# Altium footprint library PCBLIB.PcbLib: 557 footprints (part 26 of 36)
Each footprint in its own frame and in the unit in brackets; x right, y up, seen from the top. Pads: shape width x height; smd on the part's side, far side on the other; paste and mask are expansions set on the pad; w line width, h text height; cw(c..) or ccw(c..) is an arc to the next point about the centre after c.
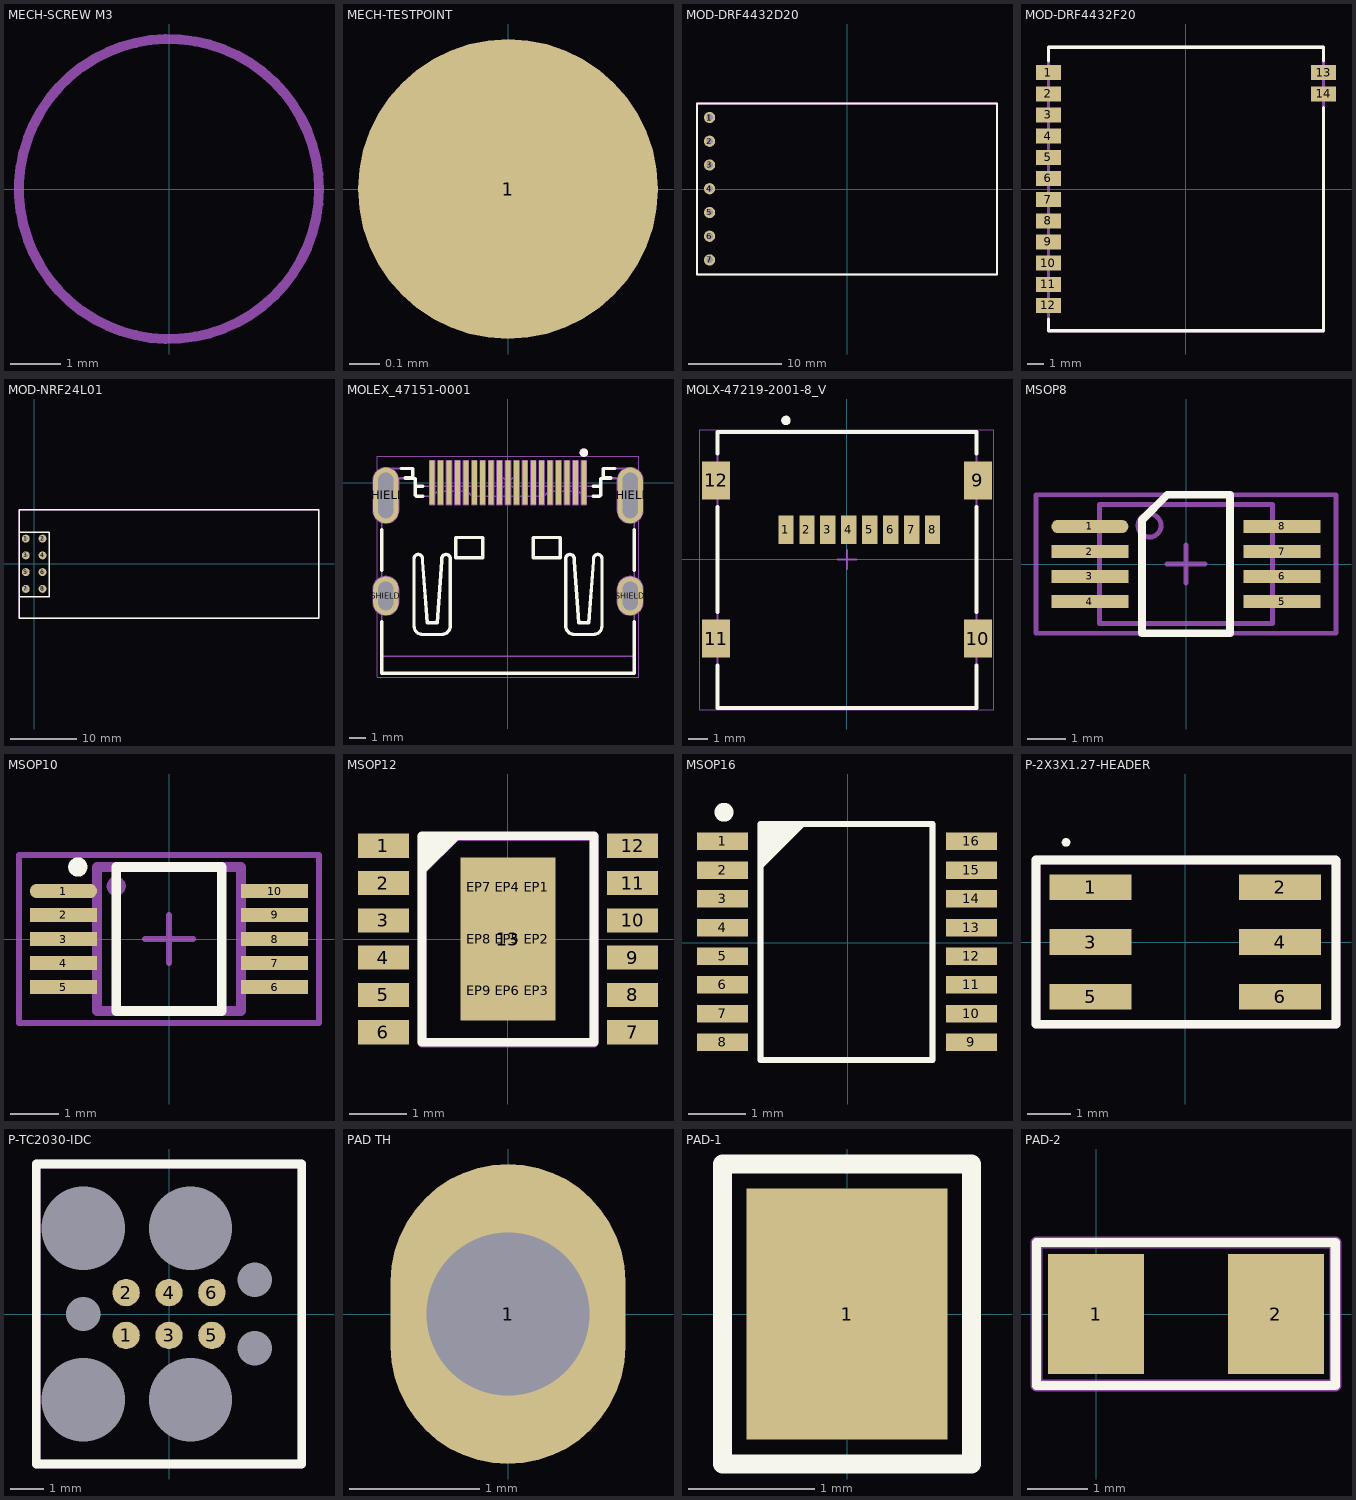
[diagram p25: the footprints below, top view; thin cyan lines are the x and y axes]

## MECH-SCREW M3 [mm] "YSB"
height 5
ASM Top:
  circle w0.2: c0,0 r3
  text ".designator" at -0.686,-0.229 h0.8
3D body "M3_YSB.STEP": height 2.37, standoff -4.99, extent -2.8,-2.8 2.803,2.8

## MECH-TESTPOINT [mm]
pads (1):
  round 1 smd paste-2 mask+0.1: 1(0,0)

## MOD-DRF4432D20 [mm]
pads (8):
  round 1.2 hole 0.7 mask+0.05: 1(-14.7,7.65) 1(-14.7,7.65) 2(-14.7,5.11) 3(-14.7,2.57) 4(-14.7,0.03) 5(-14.7,-2.51) 6(-14.7,-5.05) 7(-14.7,-7.59)
Top Overlay:
  lines w0.2: -16.05,-9.15 16.05,-9.15 16.05,9.15 -16.05,9.15 -16.05,-9.15
ASM Top:
  lines w0.2: -16.05,-9.15 16.05,-9.15 16.05,9.15 -16.05,9.15 -16.05,-9.15
  text ".designator" at -2.4,-0.3 h0.8
3D body: height 7, standoff 0, extent -16.05,-9.15 16.1,9.15

## MOD-DRF4432F20 [mm]
pads (14):
  rect 1.5x0.9 smd mask+0.05: 1(-8.25,6.985) 2(-8.25,5.715) 3(-8.25,4.445) 4(-8.25,3.175) 5(-8.25,1.905) 6(-8.25,0.635) 7(-8.25,-0.635) 8(-8.25,-1.905) 9(-8.25,-3.175) 10(-8.25,-4.445) 11(-8.25,-5.715) 12(-8.25,-6.985) 13(8.25,6.985) 14(8.25,5.715)
Top Overlay:
  lines w0.2: 8.25,4.895 8.25,-8.5 -8.25,-8.5 -8.25,-7.8 ; 8.25,7.7 8.25,8.5 -8.25,8.5 -8.25,7.7 ; -8.25,-7.8 -8.25,-7.8 ; -8.25,7.7 -8.25,7.7
ASM Top:
  lines w0.2: -8.25,-8.5 8.25,-8.5 8.25,8.5 -8.25,8.5 -8.25,-8.5
  text ".designator" at -1.3,0 h0.8
3D body "User Library-DRF4432F20.step": height 2.01, standoff 0.01, extent -8.25,-8.5 8.25,8.5

## MOD-NRF24L01 [mm]
pads (8):
  round 1.2 hole 0.6 mask+0.05: 1(-1.27,3.81) 2(1.27,3.81) 3(-1.27,1.27) 4(1.27,1.27) 5(-1.27,-1.27) 6(1.27,-1.27) 7(-1.27,-3.81) 8(1.27,-3.81)
Top Overlay:
  lines w0.2: -2.3,-1.27 -2.3,-8.29 43.2,-8.29 43.2,8.21 -2.3,8.21 -2.3,3.81 ; -2.3,-5 -2.3,4.8 2.3,4.8 2.3,-5 -2.3,-5
ASM Top:
  lines w0.2: -2.3,-8.29 -2.3,8.21 43.2,8.21 43.2,-8.29 -2.3,-8.29
  text ".designator" at 19.2,-0.5 h0.8

## MOLEX_47151-0001 [mm] "19 Pin, 0.50mm Pitch, 1.0 HDMI Right Angle Header"
height 6.18
pads (23):
  rect 0.3x2.6 smd: 1(4.5,0) 2(4,0) 3(3.5,0) 4(3,0) 5(2.5,0) 6(2,0) 7(1.5,0) 8(1,0) 9(0.5,0) 10(0,0) 11(-0.5,0) 12(-1,0) 13(-1.5,0) 14(-2,0) 15(-2.5,0) 16(-3,0) 17(-3.5,0) 18(-4,0) 19(-4.5,0)
  oval 1.5x2.3 hole 0.9 slot 1.7 at 90 deg: SHIELD(-7.25,-6.72) SHIELD(7.25,-6.72)
  oval 1.5x3.3 hole 0.9 slot 2.7 at 90 deg: SHIELD(-7.25,-0.76) SHIELD(7.25,-0.76)
Top Overlay:
  circle w0.25: c4.5,1.775 r0.125
  lines w0.2: -7.5,-8.243 -7.5,-11.31 7.5,-11.31 7.5,-8.243 ; -7.5,-5.198 -7.5,-2.782 ; -6.338,0.84 -5.65,0.84 -5.65,0.24 ; -6.11,0.29 -5.65,0.29 ; -6.104,0.24 -5.5,0.24 -5.5,-0.71 ccw(c-5.4,-0.71) -5.4,-0.81 -5.05,-0.81 ; -5.5,-0.221 -5.05,-0.221 ; 5.05,-0.81 5.4,-0.81 ccw(c5.4,-0.71) 5.5,-0.71 5.5,0.24 6.104,0.24 ; 5.05,-0.221 5.5,-0.221 ; 5.65,0.24 5.65,0.84 6.338,0.84 ; 5.65,0.29 6.11,0.29 ; 7.5,-5.198 7.5,-2.782 ; -5.575,-8.51 ccw(c-5.075,-8.51) -5.075,-9.01 -3.925,-9.01 ccw(c-3.925,-8.51) -3.425,-8.51 -3.425,-4.51 ccw(c-3.675,-4.51) -3.925,-4.51 -3.925,-4.56 -3.925,-4.66 -4.2,-8.32 -4.8,-8.32 -5.075,-4.66 -5.075,-4.51 ccw(c-5.325,-4.51) -5.575,-4.51 -5.575,-8.51 ; -3.1,-4.46 -3.1,-3.26 -1.5,-3.26 -1.5,-4.46 -3.1,-4.46 ; 1.5,-4.46 1.5,-3.26 3.1,-3.26 3.1,-4.46 1.5,-4.46 ; 3.425,-8.51 ccw(c3.925,-8.51) 3.925,-9.01 5.075,-9.01 ccw(c5.075,-8.51) 5.575,-8.51 5.575,-4.51 ccw(c5.325,-4.51) 5.075,-4.51 5.075,-4.56 5.075,-4.66 4.8,-8.32 4.2,-8.32 3.925,-4.66 3.925,-4.51 ccw(c3.675,-4.51) 3.425,-4.51 3.425,-8.51
Mechanical 8:
  drawing of 192 lines, arcs and shapes, not listed
Mechanical 14:
  circle w0.25: c4.5,1.775 r0.125
  lines w0.1: -7.45,0.24 -7.45,0.29 -5.65,0.29 ; -6.95,0.24 -6.95,0.84 -5.65,0.84 -5.65,0.24 ; -5.5,-0.221 5.5,-0.221 ; -4.6,-0.221 -4.6,0.641 -4.4,0.641 -4.4,-0.221 ; -4.1,-0.221 -4.1,0.641 -3.9,0.641 -3.9,-0.221 ; -3.6,-0.221 -3.6,0.641 -3.4,0.641 -3.4,-0.221 ; -3.1,-0.221 -3.1,0.641 -2.9,0.641 -2.9,-0.221 ; -2.6,-0.221 -2.6,0.641 -2.4,0.641 -2.4,-0.221 ; -2.1,-0.221 -2.1,0.641 -1.9,0.641 -1.9,-0.221 ; -1.6,-0.221 -1.6,0.641 -1.4,0.641 -1.4,-0.221 ; -1.1,-0.221 -1.1,0.641 -0.9,0.641 -0.9,-0.221 ; -0.6,-0.221 -0.6,0.641 -0.4,0.641 -0.4,-0.221 ; -0.1,-0.221 -0.1,0.641 0.1,0.641 0.1,-0.221 ; 0.4,-0.221 0.4,0.641 0.6,0.641 0.6,-0.221 ; 0.9,-0.221 0.9,0.641 1.1,0.641 1.1,-0.221 ; 1.4,-0.221 1.4,0.641 1.6,0.641 1.6,-0.221 ; 1.9,-0.221 1.9,0.641 2.1,0.641 2.1,-0.221 ; 2.4,-0.221 2.4,0.641 2.6,0.641 2.6,-0.221 ; 2.9,-0.221 2.9,0.641 3.1,0.641 3.1,-0.221 ; 3.4,-0.221 3.4,0.641 3.6,0.641 3.6,-0.221 ; 3.9,-0.221 3.9,0.641 4.1,0.641 4.1,-0.221 ; 4.4,-0.221 4.4,0.641 4.6,0.641 4.6,-0.221 ; 5.65,0.24 5.65,0.84 6.95,0.84 6.95,0.24 ; 5.65,0.29 7.45,0.29 7.45,0.24 ; -7.5,-11.31 -7.5,0.24 -5.5,0.24 -5.5,-0.71 ccw(c-5.4,-0.71) -5.4,-0.81 -4.48,-0.81 -4.18,-0.51 -2.42,-0.51 -2.12,-0.81 2.12,-0.81 2.42,-0.51 4.18,-0.51 4.48,-0.81 5.4,-0.81 ccw(c5.4,-0.71) 5.5,-0.71 5.5,0.24 7.5,0.24 7.5,-11.31 -7.5,-11.31 ; -5.575,-8.51 ccw(c-5.075,-8.51) -5.075,-9.01 -3.925,-9.01 ccw(c-3.925,-8.51) -3.425,-8.51 -3.425,-4.51 ccw(c-3.675,-4.51) -3.925,-4.51 -3.925,-4.56 -3.925,-4.66 -4.2,-8.32 -4.8,-8.32 -5.075,-4.66 -5.075,-4.51 ccw(c-5.325,-4.51) -5.575,-4.51 -5.575,-8.51 ; -3.1,-4.46 -3.1,-3.26 -1.5,-3.26 -1.5,-4.46 -3.1,-4.46 ; 1.5,-4.46 1.5,-3.26 3.1,-3.26 3.1,-4.46 1.5,-4.46 ; 3.425,-8.51 ccw(c3.925,-8.51) 3.925,-9.01 5.075,-9.01 ccw(c5.075,-8.51) 5.575,-8.51 5.575,-4.51 ccw(c5.325,-4.51) 5.075,-4.51 5.075,-4.56 5.075,-4.66 4.8,-8.32 4.2,-8.32 3.925,-4.66 3.925,-4.51 ccw(c3.675,-4.51) 3.425,-4.51 3.425,-8.51
Mechanical 15:
  lines w0.05: -7.75,-11.56 7.75,-11.56 7.75,1.55 -7.75,1.55 -7.75,-11.56
3D body "MOLEX_47151-0001.stp": height 6.18, standoff -2.2, extent -7.5,-11.31 7.5,0.84

## MOLX-47219-2001-8_V [mm] "CONN, 8-Leads, Body 14.5x13.6mm, Pitch 1.1mm"
height 1.9
pads (12):
  rect 0.8x1.5 smd: 1(-3.205,1.55) 2(-2.105,1.55) 3(-1.005,1.55) 4(0.095,1.55) 5(1.195,1.55) 6(2.295,1.55) 7(3.395,1.55) 8(4.495,1.55)
  rect 1.45x2 smd: 9(6.875,4.15) 10(6.875,-4.15) 11(-6.875,-4.15) 12(-6.875,4.15)
Top Overlay:
  circle w0.25: c-3.205,7.3 r0.125
  lines w0.2: -6.8,-5.55 -6.8,-7.8 6.8,-7.8 6.8,-5.55 ; -6.8,-2.75 -6.8,2.75 ; -6.8,5.55 -6.8,6.7 6.8,6.7 6.8,5.55 ; 6.8,-2.75 6.8,2.75
Mechanical 15:
  lines w0.05: -7.725,-7.9 -7.725,6.8 7.7,6.8 7.7,-7.9 -7.725,-7.9
  lines w0.1: -0.5,0 0.5,0 ; 0,-0.5 0,0.5
ASM Top:
  lines w0.1: -6.8,-7.8 -6.8,6.7 6.8,6.7 6.8,-7.8 -6.8,-7.8
  text ".designator" at -0.584,-0.051 h0.8
3D body "472192001.stp": height 1.91, standoff 0.02, extent -7.3,-7.793 7.3,6.707

## MSOP8 [mm] "TSOP, 8-Leads, Body 3,00x3,00mm, Pitch 0,65mm, IPC Medium Density"
height 1.1
pads (8):
  oval 2x0.35 smd mask+0.05: 1(-2.5,0.975)
  rect 2x0.35 smd mask+0.05: 2(-2.5,0.325) 3(-2.5,-0.325) 4(-2.5,-0.975) 5(2.5,-0.975) 6(2.5,-0.325) 7(2.5,0.325) 8(2.5,0.975)
Top Overlay:
  lines w0.2: -1.143,-1.8 -1.143,1.143 -0.486,1.8 1.143,1.8 1.143,-1.8 -1.143,-1.8
Mechanical 15:
  lines w0.127: -0.5,0 0.5,0 ; 0,-0.5 0,0.5 ; -3.9,-1.8 3.9,-1.8 3.9,1.8 -3.9,1.8 -3.9,-1.8
ASM Top:
  circle w0.127: c-0.95,1 r0.3
  lines w0.127: -1.55,-1.55 1.55,-1.55 ; -1.55,1.55 1.55,1.55 ; -2.25,-1.55 -2.25,1.55 2.25,1.55 2.25,-1.55 -2.25,-1.55
3D body "TSSOP8.step": height 1.2, standoff 0, extent -3.2,-1.55 3.2,1.55

## MSOP10 [mm] "TSSOP, 10-Leads, Body 3,00x3,00mm, Pitch 0,50mm, IPC Medium Density"
height 1.1
pads (10):
  oval 1.4x0.3 smd mask+0.05: 1(-2.2,1)
  rect 1.4x0.3 smd mask+0.05: 2(-2.2,0.5) 3(-2.2,0) 4(-2.2,-0.5) 5(-2.2,-1) 6(2.2,-1) 7(2.2,-0.5) 8(2.2,0) 9(2.2,0.5) 10(2.2,1)
Top Overlay:
  circle w0.2: c-1.9,1.5 r0.1
  lines w0.2: -1.1,-1.5 1.1,-1.5 1.1,1.5 -1.1,1.5 -1.1,-1.5
Mechanical 15:
  lines w0.127: -0.5,0 0.5,0 ; 0,-0.5 0,0.5 ; -3.125,-1.75 3.125,-1.75 3.125,1.75 -3.125,1.75 -3.125,-1.75
ASM Top:
  circle w0.2: c-1.1,1.1 r0.1
  lines w0.2: -1.5,-1.5 -1.5,1.5 1.5,1.5 1.5,-1.5 -1.5,-1.5
  text ".designator" at 0,0 h0.8
3D body "MSOP10.step": height 1.1, standoff 0, extent -2.45,-1.5 2.45,1.5

## MSOP12 [mm]
pads (22):
  rect 0.889x0.42 smd mask+0.05: 1(-2.17,1.625) 2(-2.17,0.975) 3(-2.17,0.325) 4(-2.17,-0.325) 5(-2.17,-0.975) 6(-2.17,-1.625) 7(2.171,-1.625) 8(2.171,-0.975) 9(2.171,-0.325) 10(2.171,0.325) 11(2.171,0.975) 12(2.171,1.625)
  rect 1.651x2.845 smd paste-100 mask+0.05: 13(0,0)
  rect 0.3x0.6 on Top Paste mask+0.102: EP1(0.5,0.9) EP2(0.5,0) EP3(0.5,-0.9) EP4(0,0.9) EP5(0,0) EP6(0,-0.9) EP7(-0.5,0.9) EP8(-0.5,0) EP9(-0.5,-0.9)
Top Overlay:
  region: -1.5,1.1 -0.814,1.786 -1.5,1.8
  lines w0.152: -1.5,-1.8 1.5,-1.8 1.5,1.8 -1.5,1.8 -1.5,-1.8
ASM Top:
  region: -1.5,1.085 -0.814,1.771 -1.5,1.785
  lines w0.152: -1.5,-1.815 -1.5,1.785 1.5,1.785 1.5,-1.815 -1.5,-1.815
  text ".designator" at -0.15,-0.076 h0.8
3D body "msop-12.STEP": height 1.1, standoff 0, extent -2.4,-2.02 2.5,2.02

## MSOP16 [mm]
pads (16):
  rect 0.889x0.305 smd mask+0.051: 1(-2.182,1.767) 2(-2.182,1.267) 3(-2.182,0.767) 4(-2.182,0.267) 5(-2.182,-0.233) 6(-2.182,-0.733) 7(-2.182,-1.233) 8(-2.182,-1.733) 9(2.157,-1.733) 10(2.157,-1.233) 11(2.157,-0.733) 12(2.157,-0.233) 13(2.157,0.267) 14(2.157,0.767) 15(2.157,1.267) 16(2.157,1.767)
Top Overlay:
  circle w0.254: c-2.156,2.275 r0.036
  region: -1.521,1.267 -1.521,2.072 -0.717,2.072
  lines w0.102: -1.521,-2.043 -1.521,2.072 1.476,2.072 1.476,-2.043 -1.521,-2.043
ASM Top:
  lines w0.102: -1.521,-2.043 -1.521,2.072 1.476,2.072 1.476,-2.043 -1.521,-2.043
  text ".designator" at -0.963,-0.233 h0.8
3D body "MSOP-16.STEP": height 0.87, standoff 0.01, extent -2.447,-2.005 2.453,2.034

## P-2X3X1.27-HEADER [mm]
pads (6):
  rect 1.9x0.6 smd paste-0.05: 1(-2.2,1.27)
  rect 1.9x0.6 smd: 2(2.2,1.27) 3(-2.2,0) 4(2.2,0) 5(-2.2,-1.27) 6(2.2,-1.27)
Top Overlay:
  circle w0.1: c-2.769,2.311 r0.05
  lines w0.2: 3.496,1.894 3.485,1.905 -2.926,1.905 -3.465,1.905 -3.465,-1.905 3.496,-1.905 3.496,1.894 ; 3.496,1.894 3.496,1.894
ASM Top:
  lines w0.2: -3.465,-1.905 3.496,-1.905 3.496,1.894 3.485,1.905 -3.465,1.905 -3.465,-1.905
  text ".designator" at -0.005,0 h0.8
3D body "FTSH-103-01-L-DV-TR.stp": height 5.98, standoff 0.01, extent -2.926,-1.905 2.916,1.905

## P-TC2030-IDC [mil]
pads (13):
  round 32 smd paste-50 mask+0: 1(-50,-25) 2(-50,25) 3(0,-25) 4(0,25) 5(50,-25) 6(50,25)
  round 1 hole 97 unplated mask+4: MP1(-100,100) MP2(25,100) MP3(-100,-100) MP4(25,-100)
  round 1 hole 40 unplated mask+4: MP5(-100,0) MP6(100,40) MP7(100,-40)
Top Overlay:
  lines w10: -155,-175 -155,175 155,175 155,-175 -155,-175
ASM Top:
  lines w10: -155,-175 155,-175 155,175 -155,175 -155,-175
  text ".designator" at -64,-28 h31.5

## PAD TH [mm] "1.25mm Hole"
pads (1):
  oval 1.8x2.3 hole 1.25: 1(0,0)

## PAD-1 [mm]
pads (1):
  rect 1.6x2 smd: 1(0,0)
Top Overlay:
  lines w0.152: -0.991,-1.194 -0.991,1.194 0.991,1.194 0.991,-1.194 -0.991,-1.194

## PAD-2 [mm]
pads (2):
  rect 1.6x2 smd paste-0.05 mask+0.05: 1(0,0) 2(3,0)
Top Overlay:
  lines w0.152: -0.991,-1.194 -0.991,1.194 3.988,1.194 3.988,-1.194 -0.991,-1.194
ASM Top:
  lines w0.2: -0.991,-1.194 -0.991,1.194 3.988,1.194 3.988,-1.194 -0.991,-1.194
  text ".designator" at 0.7,-0.2 h0.8
3D body: height 0.65, standoff 0, extent 0.256,-0.95 2.745,0.95
3D body: height 0.65, standoff 0, extent 2.745,-0.95 3.456,0.95
3D body: height 0.65, standoff 0, extent -0.455,-0.95 0.256,0.95